# Altium footprint library STM32F0.PcbLib: 228 footprints (part 8 of 16)
Each footprint in its own frame and in the unit in brackets; x right, y up, seen from the top. Pads: shape width x height; smd on the part's side, far side on the other; paste and mask are expansions set on the pad; w line width, h text height; cw(c..) or ccw(c..) is an arc to the next point about the centre after c.
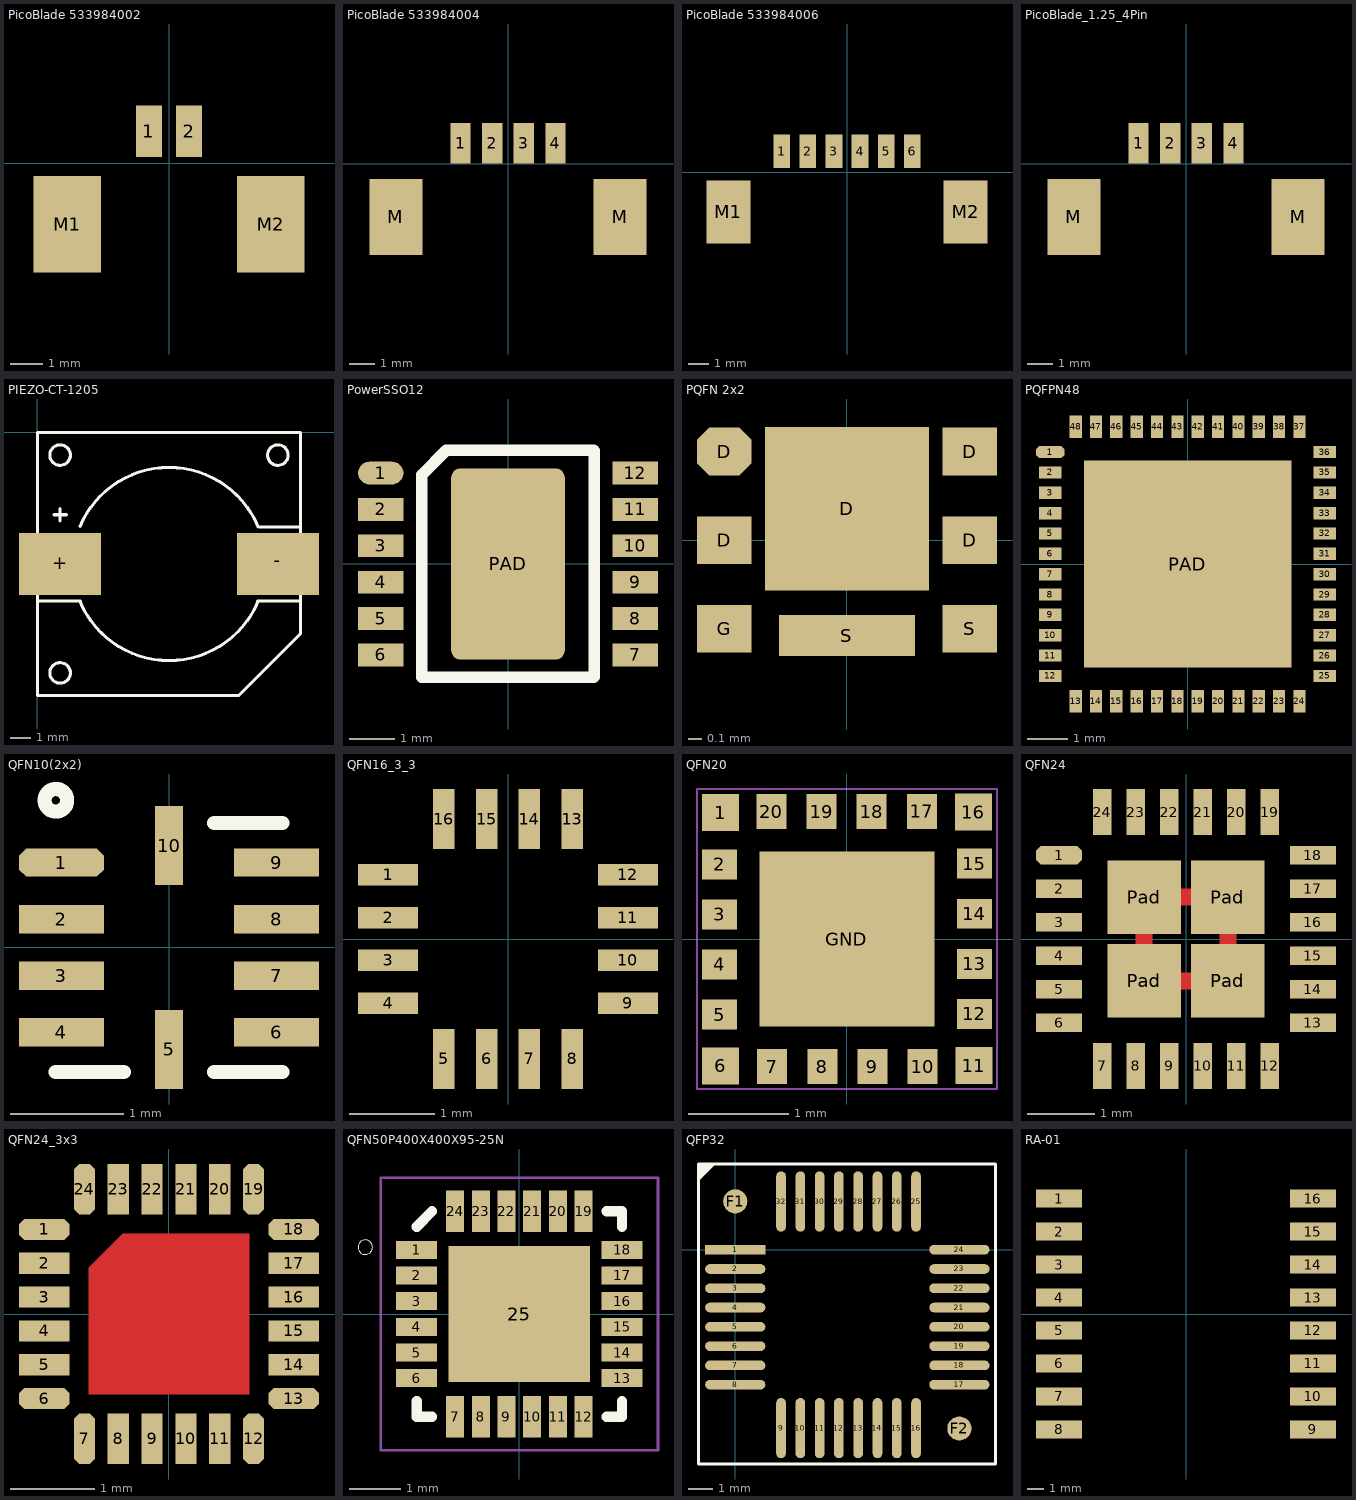
[diagram p7: the footprints below, top view; thin cyan lines are the x and y axes]

## PicoBlade 533984002 [mm]
pads (4):
  rect 0.8x1.6 smd: 1(-0.625,1) 2(0.625,1)
  rect 2.1x3 smd: M1(-3.175,-1.9) M2(3.175,-1.9)
3D body "533984002.stp": height 4.7, standoff 0, extent -3.825,-3 3.825,1.2

## PicoBlade 533984004 [mm]
pads (6):
  rect 0.8x1.6 smd: 1(-1.875,0.8) 2(-0.625,0.8) 3(0.625,0.8) 4(1.875,0.8)
  rect 2.1x3 smd: M(-4.425,-2.1) M(4.425,-2.1)
3D body "533984004.stp": height 4.7, standoff 0, extent -5.075,-3.2 5.075,1

## PicoBlade 533984006 [mm]
pads (8):
  rect 0.8x1.6 smd: 1(-3.125,1) 2(-1.875,1) 3(-0.625,1) 4(0.625,1) 5(1.875,1) 6(3.125,1)
  rect 2.1x3 smd: M1(-5.675,-1.9) M2(5.675,-1.9)
3D body "533984006.stp": height 4.7, standoff 0, extent -6.325,-3 6.325,1.2

## PicoBlade_1.25_4Pin [mm]
pads (6):
  rect 0.8x1.6 smd: 1(-1.875,0.8) 2(-0.625,0.8) 3(0.625,0.8) 4(1.875,0.8)
  rect 2.1x3 smd: M(-4.425,-2.1) M(4.425,-2.1)
3D body "53261-0471.stp": height 3.4, standoff 0, extent -5.075,-3.625 5.075,1.575

## PIEZO-CT-1205 [mm]
pads (2):
  rect 4x3 smd mask+0.051: +(1.1,-6.4) -(11.7,-6.4)
Top Overlay:
  circle w0.152: c1.1,-1.1 r0.5
  circle w0.152: c11.7,-1.1 r0.5
  circle w0.152: c1.1,-11.7 r0.5
  lines w0.152: 0,-8.2 2.1,-8.2 ; 0.8,-4 1.4,-4 ; 1.1,-4.3 1.1,-3.7 ; 2.065,-8.215 ccw(c6.4,-6.4) 10.734,-8.218 ; 2.066,-4.582 cw(c6.4,-6.4) 10.735,-4.585 ; 10.7,-8.2 12.7,-8.2 ; 10.8,-4.6 12.8,-4.6 ; 12.8,-9.7 12.8,0 0,0 0,-12.8 9.8,-12.8 12.8,-9.8 12.8,-7.4
3D body: height 10, standoff 9, extent 0,-12.8 12.8,0
3D body: height 9, standoff 0.1, extent 0,-12.8 12.8,0
3D body: height 0.76, standoff 0, extent -0.4,-7.3 2.1,-5.6
3D body: height 0.76, standoff 0, extent 10.7,-7.3 13.2,-5.6
3D body: height 10.01, standoff 10, extent 0.7,-4.4 1.5,-3.6
3D body: height 9.1, standoff 9, extent 4.6,-8 7.9,-4.8

## PowerSSO12 [mm]
pads (13):
  oval 1x0.5 smd: 1(-2.8,2)
  rect 1x0.5 smd: 2(-2.8,1.2) 3(-2.8,0.4) 4(-2.8,-0.4) 5(-2.8,-1.2) 6(-2.8,-2) 7(2.8,-2) 8(2.8,-1.2) 9(2.8,-0.4) 10(2.8,0.4) 11(2.8,1.2) 12(2.8,2)
  rrect15% 2.5x4.2 smd: PAD(0,0)
Top Overlay:
  lines w0.254: 1.89,2.5 -1.36,2.5 -1.9,1.96 -1.9,-2.49 1.89,-2.49 1.9,-2.48 1.9,2.49
3D body "User Library-ST_MICRO_PowerSSO-12.step": height 1.64, standoff 0, extent -3.1,-2.5 3.1,2.5

## PQFN 2x2 [mm]
pads (8):
  rect 0.4x0.35 smd: D(-0.9,0) D(0.9,0) D(0.9,0.65) G(-0.9,-0.65) S(0.9,-0.65)
  oct 0.4x0.35 smd: D(-0.9,0.65)
  rect 1.2x1.2 smd: D(0,0.23)
  rect 1x0.3 smd: S(0,-0.7)
3D body "User Library-PQFN 2X2.step": height 0.88, standoff -0.02, extent -1.02,-1 1.02,1

## PQFPN48 [mm]
pads (49):
  oct 0.7x0.3 smd: 1(-3.375,2.75)
  rect 0.55x0.3 smd: 2(-3.375,2.25) 3(-3.375,1.75) 4(-3.375,1.25) 5(-3.375,0.75) 6(-3.375,0.25) 7(-3.375,-0.25) 8(-3.375,-0.75) 9(-3.375,-1.25) 10(-3.375,-1.75) 11(-3.375,-2.25) 12(-3.375,-2.75) 25(3.375,-2.75) 26(3.375,-2.25) 27(3.375,-1.75) 28(3.375,-1.25) 29(3.375,-0.75) 30(3.375,-0.25) 31(3.375,0.25) 32(3.375,0.75) 33(3.375,1.25) 34(3.375,1.75) 35(3.375,2.25) 36(3.375,2.75)
  rect 0.3x0.55 smd: 13(-2.75,-3.375) 14(-2.25,-3.375) 15(-1.75,-3.375) 16(-1.25,-3.375) 17(-0.75,-3.375) 18(-0.25,-3.375) 19(0.25,-3.375) 20(0.75,-3.375) 21(1.25,-3.375) 22(1.75,-3.375) 23(2.25,-3.375) 24(2.75,-3.375) 37(2.75,3.375) 38(2.25,3.375) 39(1.75,3.375) 40(1.25,3.375) 41(0.75,3.375) 42(0.25,3.375) 43(-0.25,3.375) 44(-0.75,3.375) 45(-1.25,3.375) 46(-1.75,3.375) 47(-2.25,3.375) 48(-2.75,3.375)
  rect 5.1x5.1 smd: PAD(0,0)
3D body "User Library-UFQFPN48.step": height 0.55, standoff 0, extent -3.5,-3.5 3.5,3.5

## QFN10(2x2) [mm]
pads (10):
  oct 0.75x0.25 smd: 1(-0.95,0.75)
  rect 0.75x0.25 smd: 2(-0.95,0.25) 3(-0.95,-0.25) 4(-0.95,-0.75) 6(0.95,-0.75) 7(0.95,-0.25) 8(0.95,0.25) 9(0.95,0.75)
  rect 0.25x0.7 smd: 5(0,-0.9) 10(0,0.9)
Top Overlay:
  circle w0.125: c-1,1.3 r0.1
  lines w0.125: -1,-1.1 -0.4,-1.1 ; 0.4,-1.1 1,-1.1 ; 0.4,1.1 1,1.1
3D body "User Library-QFN10.step": height 0.5, standoff 0, extent -1,-1 1,1

## QFN16_3_3 [mm]
pads (16):
  rect 0.7x0.25 smd: 1(-1.4,0.75) 2(-1.4,0.25) 3(-1.4,-0.25) 4(-1.4,-0.75) 9(1.4,-0.75) 10(1.4,-0.25) 11(1.4,0.25) 12(1.4,0.75)
  rect 0.25x0.7 smd: 5(-0.75,-1.4) 6(-0.25,-1.4) 7(0.25,-1.4) 8(0.75,-1.4) 13(0.75,1.4) 14(0.25,1.4) 15(-0.25,1.4) 16(-0.75,1.4)
3D body "User Library-QFN16_Si3307.step": height 0.85, standoff -0.01, extent -1.5,-1.5 1.5,1.5

## QFN20 [mm]
pads (21):
  rect 0.37x0.37 smd paste-25.4 mask-25.4: 1(-1.264,1.264) 6(-1.263,-1.269) 11(1.27,-1.265) 16(1.265,1.268)
  rect 0.35x0.3 smd paste-25.4 mask-25.4: 2(-1.274,0.748) 3(-1.273,0.246) 4(-1.273,-0.254) 5(-1.273,-0.756) 12(1.275,-0.749) 13(1.275,-0.248) 14(1.275,0.253) 15(1.274,0.755)
  rect 0.3x0.35 smd paste-25.4 mask-25.4: 7(-0.747,-1.276) 8(-0.246,-1.275) 9(0.255,-1.275) 10(0.756,-1.275) 17(0.749,1.276) 18(0.247,1.275) 19(-0.253,1.275) 20(-0.755,1.275)
  rect 1.75x1.75 smd paste-25.4 mask-25.4: GND(0,0)
Top Paste:
  region: 0.599,1.451 0.599,1.101 0.899,1.101 0.899,1.451
  region: 0.097,1.45 0.097,1.1 0.397,1.1 0.397,1.45
  region: -0.403,1.45 -0.403,1.1 -0.103,1.1 -0.103,1.45
  region: -0.905,1.45 -0.905,1.1 -0.605,1.1 -0.605,1.45
  region: 1.45,-0.599 1.1,-0.599 1.1,-0.899 1.45,-0.899
  region: 1.45,-0.097 1.1,-0.098 1.1,-0.397 1.45,-0.397
  region: 1.45,0.403 1.1,0.403 1.1,0.103 1.45,0.103
  region: 1.449,0.905 1.099,0.905 1.099,0.605 1.449,0.605
  region: 1.45,1.083 1.45,1.453 1.08,1.453 1.08,1.083
  region: -0.597,-1.451 -0.597,-1.101 -0.897,-1.101 -0.897,-1.451
  region: -0.096,-1.45 -0.096,-1.1 -0.396,-1.1 -0.396,-1.45
  region: 0.405,-1.45 0.405,-1.1 0.105,-1.1 0.105,-1.45
  region: 0.906,-1.45 0.906,-1.1 0.606,-1.1 0.606,-1.45
  region: 1.085,-1.45 1.455,-1.45 1.455,-1.08 1.085,-1.08
  region: -1.449,0.598 -1.099,0.598 -1.099,0.898 -1.449,0.898
  region: -1.448,0.096 -1.098,0.096 -1.098,0.396 -1.448,0.396
  region: -1.448,-0.404 -1.098,-0.404 -1.098,-0.104 -1.448,-0.104
  region: -1.448,-0.906 -1.098,-0.906 -1.098,-0.606 -1.448,-0.606
  region: -1.449,1.448 -1.449,1.079 -1.079,1.079 -1.079,1.448
  region: -1.448,-1.084 -1.448,-1.454 -1.078,-1.454 -1.078,-1.084
  region: 0.875,-0.875 0.875,0.875 -0.875,0.875 -0.875,-0.875
Top Solder:
  region: 0.599,1.451 0.599,1.101 0.899,1.101 0.899,1.451
  region: 0.097,1.45 0.097,1.1 0.397,1.1 0.397,1.45
  region: -0.403,1.45 -0.403,1.1 -0.103,1.1 -0.103,1.45
  region: -0.905,1.45 -0.905,1.1 -0.605,1.1 -0.605,1.45
  region: 1.45,-0.599 1.1,-0.599 1.1,-0.899 1.45,-0.899
  region: 1.45,-0.097 1.1,-0.098 1.1,-0.397 1.45,-0.397
  region: 1.45,0.403 1.1,0.403 1.1,0.103 1.45,0.103
  region: 1.449,0.905 1.099,0.905 1.099,0.605 1.449,0.605
  region: 1.45,1.083 1.45,1.453 1.08,1.453 1.08,1.083
  region: -0.597,-1.451 -0.597,-1.101 -0.897,-1.101 -0.897,-1.451
  region: -0.096,-1.45 -0.096,-1.1 -0.396,-1.1 -0.396,-1.45
  region: 0.405,-1.45 0.405,-1.1 0.105,-1.1 0.105,-1.45
  region: 0.906,-1.45 0.906,-1.1 0.606,-1.1 0.606,-1.45
  region: 1.085,-1.45 1.455,-1.45 1.455,-1.08 1.085,-1.08
  region: -1.449,0.598 -1.099,0.598 -1.099,0.898 -1.449,0.898
  region: -1.448,0.096 -1.098,0.096 -1.098,0.396 -1.448,0.396
  region: -1.448,-0.404 -1.098,-0.404 -1.098,-0.104 -1.448,-0.104
  region: -1.448,-0.906 -1.098,-0.906 -1.098,-0.606 -1.448,-0.606
  region: -1.449,1.448 -1.449,1.079 -1.079,1.079 -1.079,1.448
  region: -1.448,-1.084 -1.448,-1.454 -1.078,-1.454 -1.078,-1.084
  region: 0.875,-0.875 0.875,0.875 -0.875,0.875 -0.875,-0.875
Mechanical 1:
  lines w0.02: -1.5,-1.499 -1.5,1.501 1.5,1.501 1.5,-1.499 -1.5,-1.499
3D body "SW3dPS-QFN-20.STEP": height 0.62, standoff -0.08, extent -1.512,-1.506 1.488,1.494

## QFN24 [mm]
pads (28):
  oct 0.69x0.28 smd: 1(-1.895,1.25)
  rect 0.69x0.28 smd: 2(-1.895,0.75) 3(-1.895,0.25) 4(-1.895,-0.25) 5(-1.895,-0.75) 6(-1.895,-1.25) 13(1.895,-1.25) 14(1.895,-0.75) 15(1.895,-0.25) 16(1.895,0.25) 17(1.895,0.75) 18(1.895,1.25)
  rect 0.28x0.69 smd: 7(-1.25,-1.895) 8(-0.75,-1.895) 9(-0.25,-1.895) 10(0.25,-1.895) 11(0.75,-1.895) 12(1.25,-1.895) 19(1.25,1.895) 20(0.75,1.895) 21(0.25,1.895) 22(-0.25,1.895) 23(-0.75,1.895) 24(-1.25,1.895)
  rect 1.1x1.1 smd: Pad(-0.625,-0.625) Pad(-0.625,0.625) Pad(0.625,-0.625) Pad(0.625,0.625)
Top Layer:
  lines w0.254: -0.625,-0.625 -0.625,0.625 0.625,0.625 0.625,-0.625 -0.625,-0.625

## QFN24_3x3 [mm]
pads (24):
  oct 0.6x0.25 smd: 1(-1.475,1) 6(-1.475,-1) 13(1.475,-1) 18(1.475,1)
  rect 0.6x0.25 smd: 2(-1.475,0.6) 3(-1.475,0.2) 4(-1.475,-0.2) 5(-1.475,-0.6) 14(1.475,-0.6) 15(1.475,-0.2) 16(1.475,0.2) 17(1.475,0.6)
  oct 0.25x0.6 smd: 7(-1,-1.475) 12(1,-1.475) 19(1,1.475) 24(-1,1.475)
  rect 0.25x0.6 smd: 8(-0.6,-1.475) 9(-0.2,-1.475) 10(0.2,-1.475) 11(0.6,-1.475) 20(0.6,1.475) 21(0.2,1.475) 22(-0.2,1.475) 23(-0.6,1.475)
Top Layer:
  region: -0.55,0.95 0.95,0.95 0.95,-0.95 -0.95,-0.95 -0.95,0.55
3D body "User Library-MPU9250 (1).step": height 1, standoff -0.05, extent -1.51,-1.51 1.51,1.51

## QFN50P400X400X95-25N [mm]
pads (25):
  rect 0.8x0.35 smd paste-25.4 mask-25.4: 1(-2,1.25) 2(-2,0.75) 3(-2,0.25) 4(-2,-0.25) 5(-2,-0.75) 6(-2,-1.25) 13(2,-1.25) 14(2,-0.75) 15(2,-0.25) 16(2,0.25) 17(2,0.75) 18(2,1.25)
  rect 0.35x0.8 smd paste-25.4 mask-25.4: 7(-1.25,-2) 8(-0.75,-2) 9(-0.25,-2) 10(0.25,-2) 11(0.75,-2) 12(1.25,-2) 19(1.25,2) 20(0.75,2) 21(0.25,2) 22(-0.25,2) 23(-0.75,2) 24(-1.25,2)
  rect 2.75x2.65 smd mask-25.4: 25(0,0)
Top Overlay:
  circle w0: c-3,1.3 r0.141
  lines w0.2: -2,-1.7 -2,-2 -1.7,-2 ; -2,1.7 -1.7,2 ; 1.7,-2 2,-2 2,-1.7 ; 1.7,2 2,2 2,1.7
Top Paste:
  region: -1.425,2.4 -1.425,1.6 -1.075,1.6 -1.075,2.4
  region: -0.925,2.4 -0.925,1.6 -0.575,1.6 -0.575,2.4
  region: -0.425,2.4 -0.425,1.6 -0.075,1.6 -0.075,2.4
  region: 0.075,2.4 0.075,1.6 0.425,1.6 0.425,2.4
  region: 0.575,2.4 0.575,1.6 0.925,1.6 0.925,2.4
  region: 1.075,2.4 1.075,1.6 1.425,1.6 1.425,2.4
  region: 2.4,1.425 1.6,1.425 1.6,1.075 2.4,1.075
  region: 2.4,0.925 1.6,0.925 1.6,0.575 2.4,0.575
  region: 2.4,0.425 1.6,0.425 1.6,0.075 2.4,0.075
  region: 2.4,-0.075 1.6,-0.075 1.6,-0.425 2.4,-0.425
  region: 2.4,-0.575 1.6,-0.575 1.6,-0.925 2.4,-0.925
  region: 2.4,-1.075 1.6,-1.075 1.6,-1.425 2.4,-1.425
  region: 1.425,-2.4 1.425,-1.6 1.075,-1.6 1.075,-2.4
  region: 0.925,-2.4 0.925,-1.6 0.575,-1.6 0.575,-2.4
  region: 0.425,-2.4 0.425,-1.6 0.075,-1.6 0.075,-2.4
  region: -0.075,-2.4 -0.075,-1.6 -0.425,-1.6 -0.425,-2.4
  region: -0.575,-2.4 -0.575,-1.6 -0.925,-1.6 -0.925,-2.4
  region: -1.075,-2.4 -1.075,-1.6 -1.425,-1.6 -1.425,-2.4
  region: -2.4,-1.425 -1.6,-1.425 -1.6,-1.075 -2.4,-1.075
  region: -2.4,-0.925 -1.6,-0.925 -1.6,-0.575 -2.4,-0.575
  region: -2.4,-0.425 -1.6,-0.425 -1.6,-0.075 -2.4,-0.075
  region: -2.4,0.075 -1.6,0.075 -1.6,0.425 -2.4,0.425
  region: -2.4,0.575 -1.6,0.575 -1.6,0.925 -2.4,0.925
  region: -2.4,1.075 -1.6,1.075 -1.6,1.425 -2.4,1.425
Top Solder:
  region: -1.475,-1.425 1.475,-1.425 1.475,1.425 -1.475,1.425
  region: -1.525,2.5 -1.525,1.5 -0.975,1.5 -0.975,2.5
  region: -1.025,2.5 -1.025,1.5 -0.475,1.5 -0.475,2.5
  region: -0.525,2.5 -0.525,1.5 0.025,1.5 0.025,2.5
  region: -0.025,2.5 -0.025,1.5 0.525,1.5 0.525,2.5
  region: 0.475,2.5 0.475,1.5 1.025,1.5 1.025,2.5
  region: 0.975,2.5 0.975,1.5 1.525,1.5 1.525,2.5
  region: 2.5,1.525 1.5,1.525 1.5,0.975 2.5,0.975
  region: 2.5,1.025 1.5,1.025 1.5,0.475 2.5,0.475
  region: 2.5,0.525 1.5,0.525 1.5,-0.025 2.5,-0.025
  region: 2.5,0.025 1.5,0.025 1.5,-0.525 2.5,-0.525
  region: 2.5,-0.475 1.5,-0.475 1.5,-1.025 2.5,-1.025
  region: 2.5,-0.975 1.5,-0.975 1.5,-1.525 2.5,-1.525
  region: 1.525,-2.5 1.525,-1.5 0.975,-1.5 0.975,-2.5
  region: 1.025,-2.5 1.025,-1.5 0.475,-1.5 0.475,-2.5
  region: 0.525,-2.5 0.525,-1.5 -0.025,-1.5 -0.025,-2.5
  region: 0.025,-2.5 0.025,-1.5 -0.525,-1.5 -0.525,-2.5
  region: -0.475,-2.5 -0.475,-1.5 -1.025,-1.5 -1.025,-2.5
  region: -0.975,-2.5 -0.975,-1.5 -1.525,-1.5 -1.525,-2.5
  region: -2.5,-1.525 -1.5,-1.525 -1.5,-0.975 -2.5,-0.975
  region: -2.5,-1.025 -1.5,-1.025 -1.5,-0.475 -2.5,-0.475
  region: -2.5,-0.525 -1.5,-0.525 -1.5,0.025 -2.5,0.025
  region: -2.5,-0.025 -1.5,-0.025 -1.5,0.525 -2.5,0.525
  region: -2.5,0.475 -1.5,0.475 -1.5,1.025 -2.5,1.025
  region: -2.5,0.975 -1.5,0.975 -1.5,1.525 -2.5,1.525
Mechanical 1:
  lines w0.05: -2.7,-2.65 -2.7,2.65 2.7,2.65 2.7,-2.65 -2.7,-2.65
3D body "User Library-QFN24-0_5.STEP": height 1, standoff 0, extent -2,-2 2,2

## QFP32 [mm]
pads (34):
  rect 2.5x0.4 smd: 1(0,0)
  oval 2.5x0.4 smd: 2(0,-0.8) 3(0,-1.6) 4(0,-2.4) 5(0,-3.2) 6(0,-4) 7(0,-4.8) 8(0,-5.6) 17(9.3,-5.6) 18(9.3,-4.8) 19(9.3,-4) 20(9.3,-3.2) 21(9.3,-2.4) 22(9.3,-1.6) 23(9.3,-0.8) 24(9.3,0)
  oval 0.4x2.5 smd: 9(1.9,-7.4) 10(2.7,-7.4) 11(3.5,-7.4) 12(4.3,-7.4) 13(5.1,-7.4) 14(5.9,-7.4) 15(6.7,-7.4) 16(7.5,-7.4) 25(7.5,2) 26(6.7,2) 27(5.9,2) 28(5.1,2) 29(4.3,2) 30(3.5,2) 31(2.7,2) 32(1.9,2)
  round 1 smd: F1(0,2.007) F2(9.296,-7.417)
Top Overlay:
  lines w0.127: -0.889,3.556 -1.524,2.921 -1.524,3.048 -1.016,3.556 -1.143,3.556 -1.524,3.175 -1.524,3.302 -1.27,3.556 -1.524,3.556 ; -1.524,3.556 -1.524,-8.89 10.795,-8.89 10.795,3.556 -1.524,3.556 ; -1.524,3.556 -1.487,3.556 ; -1.487,3.556 -1.315,3.384 -1.442,3.384 -1.487,3.429 -1.487,3.556
3D body "User Library-TQFP-32.STEP": height 1.4, standoff -0.06, extent 0.199,-7.294 9.199,1.706

## RA-01 [mm]
pads (16):
  rect 2.8x1.1 smd: 1(-7.7,7) 2(-7.7,5) 3(-7.7,3) 4(-7.7,1) 5(-7.7,-1) 6(-7.7,-3) 7(-7.7,-5) 8(-7.7,-7) 9(7.7,-7) 10(7.7,-5) 11(7.7,-3) 12(7.7,-1) 13(7.7,1) 14(7.7,3) 15(7.7,5) 16(7.7,7)
3D body "User Library-RFM96W.STEP": height 2.09, standoff -0.14, extent -8.001,-7.95 8.001,7.95